# Altium footprint library adafruit.PCBLIB: 648 footprints (part 33 of 41)
Each footprint in its own frame and in the unit in brackets; x right, y up, seen from the top. Pads: shape width x height; smd on the part's side, far side on the other; paste and mask are expansions set on the pad; w line width, h text height; cw(c..) or ccw(c..) is an arc to the next point about the centre after c.
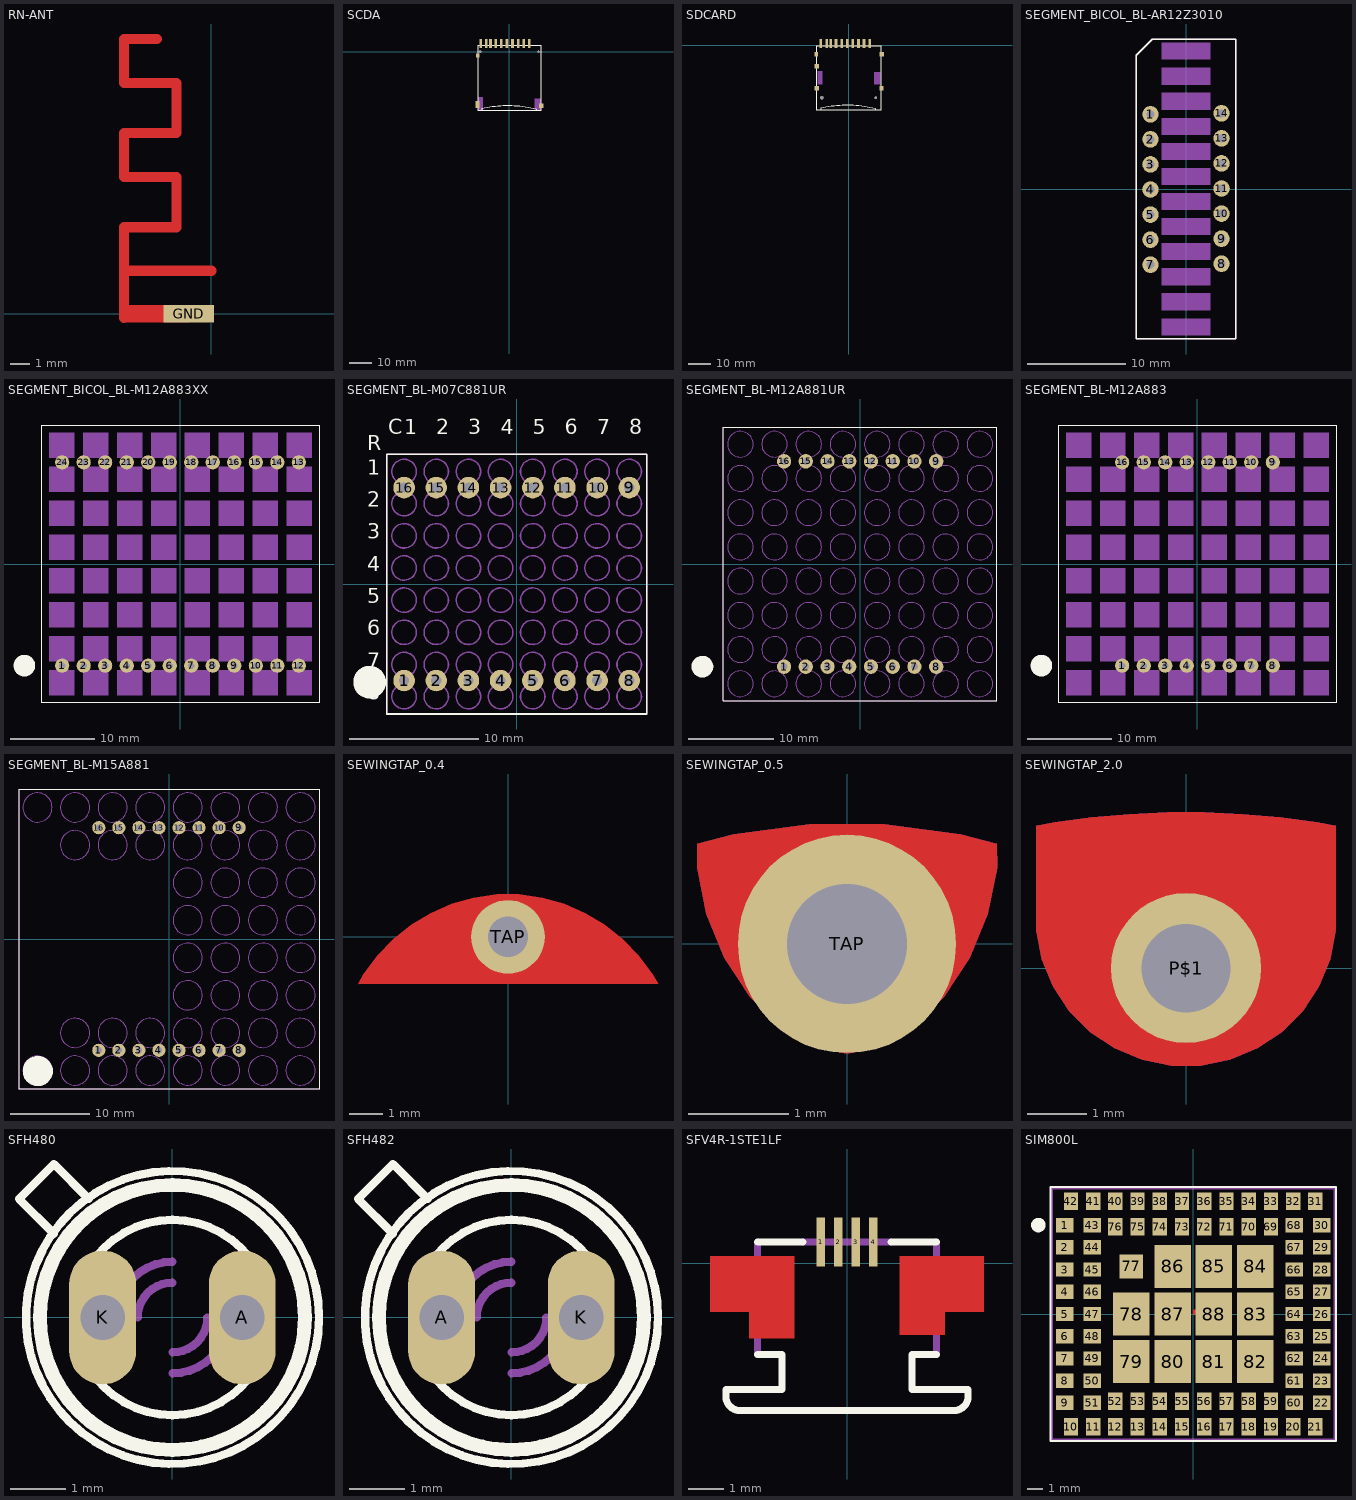
[diagram p32: the footprints below, top view; thin cyan lines are the x and y axes]

## RN-ANT [mil]
pads (2):
  rect 1x1 smd: FEED(0,85)
  rect 100x35 smd: GND(-45,0)
Top Layer:
  lines w20: -173,-8 -173,85 ; -108,543 -173,543 -173,456 -69,456 -69,357 -173,357 -173,270 -69,270 -69,171 -173,171 -173,85 ; 0,85 -173,85
  lines w35: -165,0 -50,0

## SCDA [mm]
pads (15):
  round 1 hole 1: 1(-13,0) 1(13,0)
  rect 1.2x4 smd: 1(6.4,3.7) 2(3.9,3.7) 3(1.4,3.7) 4(-1.1,3.7) 5(-3.6,3.7) 6(-6.1,3.7) 7(-8.4,3.7) 8(-10.4,3.7) 9(8.9,3.7) 10(-12.8,3.7)
  rect 1.7x1.8 smd: 11(-14.1,-1.7)
  rect 1.7x3.1 smd: 12(-14.2,-23.5)
  rect 1.9x1.9 smd: 13(14.2,-24.1)
Top Overlay:
  lines w0.127: -12.4,-26.3 12,-26.3 ; -12.4,-26.3 -14,-26.3 -14,2.8 14.1,2.8 14.1,-26.3 12,-26.3 ; -12.4,-26.3 -12.4,-25.5 cw(c-0.615,-76.23) 12,-25.7 12,-26.3
Mechanical 27:
  rectangle: -14,-26.3 -11.7,-20.2
  rectangle: 11.3,-26.3 14.1,-20.8
  region: 0,0 0.254,0 0.254,0.254 0,0.254

## SDCARD [mm]
pads (17):
  round 1.5 hole 1.5: 1(-12,-23.31)
  rect 1.2x4 smd: 1(6.8,0.89) 2(4.3,0.89) 3(1.8,0.89) 4(-0.7,0.89) 5(-3.1,0.89) 6(-5.7,0.89) 7(-8.1,0.89) 8(-9.8,0.89) 9(9.3,0.89) CD(-12.5,0.89)
  round 1 hole 1: 1(12,-23.31)
  rect 2.032x2.032 smd: COM(-14.2,-9.3) WP(-14.2,-19)
  rect 1.7x1.8 smd: MT1(-14.5,-3.91)
  rect 1.9x1.9 smd: MT2(14.7,-3.91) MT3(14.6,-19.01)
Top Overlay:
  lines w0.127: -12.6,-28.81 11.8,-28.81 ; -12.6,-28.81 -14.2,-28.81 -14.2,-0.01 14.3,-0.01 14.3,-28.81 11.8,-28.81 ; -12.6,-28.81 -12.6,-28.01 cw(c-0.815,-78.74) 11.8,-28.21 11.8,-28.81
Mechanical 27:
  rectangle: -14,-17.41 -11.7,-11.31
  rectangle: 11.3,-17.41 14.1,-11.91
  region: 0,0 0.254,0 0.254,0.254 0,0.254

## SEGMENT_BICOL_BL-AR12Z3010 [mil]
pads (14):
  round 66 hole 31.5: 1(-141.73,298.03) 2(-141.73,198.03) 3(-141.73,98.03) 4(-141.73,-1.97) 5(-141.73,-101.97) 6(-141.73,-201.97) 7(-141.73,-301.97) 8(141.73,-298.03) 9(141.73,-198.03) 10(141.73,-98.03) 11(141.73,1.97) 12(141.73,101.97) 13(141.73,201.97) 14(141.73,301.97)
Top Overlay:
  lines w5: -198.82,-598.43 198.82,-598.43 198.82,598.43 -134.06,598.43 -198.82,534.45 -198.82,-598.43
Mechanical 16:
  rectangle: -98.43,15.75 98.43,84.25
  rectangle: -98.43,115.75 98.43,184.25
  rectangle: -98.43,215.75 98.43,284.25
  rectangle: -98.43,315.75 98.43,384.25
  rectangle: -98.43,415.75 98.43,484.25
  rectangle: -98.43,515.75 98.43,584.25
  rectangle: -98.43,-84.25 98.43,-15.75
  rectangle: -98.43,-184.25 98.43,-115.75
  rectangle: -98.43,-284.25 98.43,-215.75
  rectangle: -98.43,-384.25 98.43,-315.75
  rectangle: -98.43,-484.25 98.43,-415.75
  rectangle: -98.43,-584.25 98.43,-515.75
  lines w5: -198.82,-598.43 198.82,-598.43 198.82,598.43 -134.06,598.43 -198.82,534.45 -198.82,-598.43
  text "A" at 225,525 h77.5
  text "B" at 225,425 h77.5
  text "C" at 225,325 h77.5
  text "D" at 225,225 h77.5
  text "E" at 225,125 h77.5
  text "F" at 225,25 h77.5
  text "G" at 225,-75 h77.5
  text "H" at 225,-175 h77.5
  text "I" at 225,-275 h77.5
  text "J" at 225,-375 h77.5
  text "K" at 225,-475 h77.5
  text "L" at 225,-575 h77.5

## SEGMENT_BICOL_BL-M12A883XX [mil]
pads (24):
  round 66 hole 31.5: 1(-550,-472.44) 2(-450,-472.44) 3(-350,-472.44) 4(-250,-472.44) 5(-150,-472.44) 6(-50,-472.44) 7(50,-472.44) 8(150,-472.44) 9(250,-472.44) 10(350,-472.44) 11(450,-472.44) 12(550,-472.44) 13(550,472.44) 14(450,472.44) 15(350,472.44) 16(250,472.44) 17(150,472.44) 18(50,472.44) 19(-50,472.44) 20(-150,472.44) 21(-250,472.44) 22(-350,472.44) 23(-450,472.44) 24(-550,472.44)
Top Overlay:
  circle w50: c-725.59,-472.44 r25
  lines w5: -643.7,-643.7 643.7,-643.7 643.7,643.7 -643.7,643.7 -643.7,-643.7
Mechanical 16:
  rectangle: -610.24,492.13 -492.13,610.24
  rectangle: -452.76,492.13 -334.65,610.24
  rectangle: -295.28,492.13 -177.17,610.24
  rectangle: -137.8,492.13 -19.69,610.24
  rectangle: 19.69,492.13 137.8,610.24
  rectangle: 177.17,492.13 295.28,610.24
  rectangle: 334.65,492.13 452.76,610.24
  rectangle: 492.13,492.13 610.24,610.24
  rectangle: 492.13,334.65 610.24,452.76
  rectangle: 334.65,334.65 452.76,452.76
  rectangle: 177.17,334.65 295.28,452.76
  rectangle: 19.69,334.65 137.8,452.76
  rectangle: -137.8,334.65 -19.69,452.76
  rectangle: -295.28,334.65 -177.17,452.76
  rectangle: -610.24,334.65 -492.13,452.76
  rectangle: -452.76,334.65 -334.65,452.76
  rectangle: -610.24,177.17 -492.13,295.28
  rectangle: -452.76,177.17 -334.65,295.28
  rectangle: -295.28,177.17 -177.17,295.28
  rectangle: -137.8,177.17 -19.69,295.28
  rectangle: 19.69,177.17 137.8,295.28
  rectangle: 177.17,177.17 295.28,295.28
  rectangle: 334.65,177.17 452.76,295.28
  rectangle: 492.13,177.17 610.24,295.28
  rectangle: 492.13,19.69 610.24,137.8
  rectangle: 492.13,-137.8 610.24,-19.69
  rectangle: 334.65,-137.8 452.76,-19.69
  rectangle: 334.65,19.69 452.76,137.8
  rectangle: 177.17,19.69 295.28,137.8
  rectangle: 19.69,19.69 137.8,137.8
  rectangle: -137.8,19.69 -19.69,137.8
  rectangle: -295.28,19.69 -177.17,137.8
  rectangle: -452.76,19.69 -334.65,137.8
  rectangle: -610.24,19.69 -492.13,137.8
  rectangle: -610.24,-137.8 -492.13,-19.69
  rectangle: -452.76,-137.8 -334.65,-19.69
  rectangle: -295.28,-137.8 -177.17,-19.69
  rectangle: -137.8,-137.8 -19.69,-19.69
  rectangle: 19.69,-137.8 137.8,-19.69
  rectangle: 177.17,-137.8 295.28,-19.69
  rectangle: 492.13,-295.28 610.24,-177.17
  rectangle: 334.65,-295.28 452.76,-177.17
  rectangle: -610.24,-295.28 -492.13,-177.17
  rectangle: -452.76,-295.28 -334.65,-177.17
  rectangle: -295.28,-295.28 -177.17,-177.17
  rectangle: -137.8,-295.28 -19.69,-177.17
  rectangle: 19.69,-295.28 137.8,-177.17
  rectangle: 177.17,-295.28 295.28,-177.17
  rectangle: 492.13,-452.76 610.24,-334.65
  rectangle: 334.65,-452.76 452.76,-334.65
  rectangle: -610.24,-452.76 -492.13,-334.65
  rectangle: -452.76,-452.76 -334.65,-334.65
  rectangle: -295.28,-452.76 -177.17,-334.65
  rectangle: -137.8,-452.76 -19.69,-334.65
  rectangle: 19.69,-452.76 137.8,-334.65
  rectangle: 177.17,-452.76 295.28,-334.65
  rectangle: 492.13,-610.24 610.24,-492.13
  rectangle: 334.65,-610.24 452.76,-492.13
  rectangle: -610.24,-610.24 -492.13,-492.13
  rectangle: -452.76,-610.24 -334.65,-492.13
  rectangle: -295.28,-610.24 -177.17,-492.13
  rectangle: -137.8,-610.24 -19.69,-492.13
  rectangle: 19.69,-610.24 137.8,-492.13
  rectangle: 177.17,-610.24 295.28,-492.13
  lines w5: -643.7,-643.7 643.7,-643.7 643.7,643.7 -643.7,643.7 -643.7,-643.7

## SEGMENT_BL-M07C881UR [mil]
pads (16):
  round 66 hole 31.5: 1(-344.49,-295.28) 2(-246.06,-295.28) 3(-147.64,-295.28) 4(-49.21,-295.28) 5(49.21,-295.28) 6(147.64,-295.28) 7(246.06,-295.28) 8(344.49,-295.28) 9(344.49,295.28) 10(246.06,295.28) 11(147.64,295.28) 12(49.21,295.28) 13(-49.21,295.28) 14(-147.64,295.28) 15(-246.06,295.28) 16(-344.49,295.28)
Top Overlay:
  circle w50: c-450,-300 r25
  lines w5: -397.64,-397.64 397.64,-397.64 397.64,397.64 -397.64,397.64 -397.64,-397.64
  text "C" at -393.7,442.91 h77.5
  text "R" at -457.09,393.7 h77.5
  text "1" at -344.49,442.91 h77.5
  text "2" at -246.06,442.91 h77.5
  text "3" at -147.64,442.91 h77.5
  text "4" at -49.21,442.91 h77.5
  text "5" at 49.21,442.91 h77.5
  text "6" at 147.64,442.91 h77.5
  text "7" at 246.06,442.91 h77.5
  text "8" at 344.49,442.91 h77.5
  text "1" at -457.09,319.88 h77.5
  text "2" at -457.09,221.46 h77.5
  text "3" at -457.09,123.03 h77.5
  text "4" at -457.09,24.61 h77.5
  text "5" at -457.09,-73.82 h77.5
  text "6" at -457.09,-172.24 h77.5
  text "7" at -457.09,-270.67 h77.5
  text "8" at -457.09,-369.09 h77.5
Mechanical 16:
  circle w5: c-344.49,344.49 r37.4
  circle w5: c-246.06,344.49 r37.4
  circle w5: c-147.64,344.49 r37.4
  circle w5: c-49.21,344.49 r37.4
  circle w5: c49.21,344.49 r37.4
  circle w5: c147.64,344.49 r37.4
  circle w5: c246.06,344.49 r37.4
  circle w5: c344.49,344.49 r37.4
  circle w5: c-344.49,246.06 r37.4
  circle w5: c-246.06,246.06 r37.4
  circle w5: c-147.64,246.06 r37.4
  circle w5: c-49.21,246.06 r37.4
  circle w5: c49.21,246.06 r37.4
  circle w5: c147.64,246.06 r37.4
  circle w5: c246.06,246.06 r37.4
  circle w5: c344.49,246.06 r37.4
  circle w5: c-344.49,147.64 r37.4
  circle w5: c-246.06,147.64 r37.4
  circle w5: c-147.64,147.64 r37.4
  circle w5: c-49.21,147.64 r37.4
  circle w5: c49.21,147.64 r37.4
  circle w5: c147.64,147.64 r37.4
  circle w5: c246.06,147.64 r37.4
  circle w5: c344.49,147.64 r37.4
  circle w5: c-344.49,49.21 r37.4
  circle w5: c-246.06,49.21 r37.4
  circle w5: c-147.64,49.21 r37.4
  circle w5: c-49.21,49.21 r37.4
  circle w5: c49.21,49.21 r37.4
  circle w5: c147.64,49.21 r37.4
  circle w5: c246.06,49.21 r37.4
  circle w5: c344.49,49.21 r37.4
  circle w5: c-344.49,-49.21 r37.4
  circle w5: c-246.06,-49.21 r37.4
  circle w5: c-147.64,-49.21 r37.4
  circle w5: c-49.21,-49.21 r37.4
  circle w5: c49.21,-49.21 r37.4
  circle w5: c147.64,-49.21 r37.4
  circle w5: c246.06,-49.21 r37.4
  circle w5: c344.49,-49.21 r37.4
  circle w5: c-344.49,-147.64 r37.4
  circle w5: c-246.06,-147.64 r37.4
  circle w5: c-147.64,-147.64 r37.4
  circle w5: c-49.21,-147.64 r37.4
  circle w5: c49.21,-147.64 r37.4
  circle w5: c147.64,-147.64 r37.4
  circle w5: c246.06,-147.64 r37.4
  circle w5: c344.49,-147.64 r37.4
  circle w5: c-344.49,-246.06 r37.4
  circle w5: c-246.06,-246.06 r37.4
  circle w5: c-147.64,-246.06 r37.4
  circle w5: c-49.21,-246.06 r37.4
  circle w5: c49.21,-246.06 r37.4
  circle w5: c147.64,-246.06 r37.4
  circle w5: c246.06,-246.06 r37.4
  circle w5: c344.49,-246.06 r37.4
  circle w5: c-344.49,-344.49 r37.4
  circle w5: c-246.06,-344.49 r37.4
  circle w5: c-147.64,-344.49 r37.4
  circle w5: c-49.21,-344.49 r37.4
  circle w5: c49.21,-344.49 r37.4
  circle w5: c147.64,-344.49 r37.4
  circle w5: c246.06,-344.49 r37.4
  circle w5: c344.49,-344.49 r37.4
  lines w5: -397.64,-397.64 397.64,-397.64 397.64,397.64 -397.64,397.64 -397.64,-397.64

## SEGMENT_BL-M12A881UR [mil]
pads (16):
  round 66 hole 31.5: 1(-350,-472.44) 2(-250,-472.44) 3(-150,-472.44) 4(-50,-472.44) 5(50,-472.44) 6(150,-472.44) 7(250,-472.44) 8(350,-472.44) 9(350,472.44) 10(250,472.44) 11(150,472.44) 12(50,472.44) 13(-50,472.44) 14(-150,472.44) 15(-250,472.44) 16(-350,472.44)
Top Overlay:
  circle w50: c-725.59,-472.44 r25
  lines w5: -629.92,-629.92 -629.92,629.92 629.92,629.92 629.92,-629.92 -629.92,-629.92
Mechanical 16:
  circle w5: c551.18,-551.18 r59.06
  circle w5: c393.7,-551.18 r59.06
  circle w5: c236.22,-551.18 r59.06
  circle w5: c78.74,-551.18 r59.06
  circle w5: c-78.74,-551.18 r59.06
  circle w5: c-236.22,-551.18 r59.06
  circle w5: c-393.7,-551.18 r59.06
  circle w5: c-551.18,-551.18 r59.06
  circle w5: c551.18,-393.7 r59.06
  circle w5: c393.7,-393.7 r59.06
  circle w5: c236.22,-393.7 r59.06
  circle w5: c78.74,-393.7 r59.06
  circle w5: c-78.74,-393.7 r59.06
  circle w5: c-236.22,-393.7 r59.06
  circle w5: c-393.7,-393.7 r59.06
  circle w5: c-551.18,-393.7 r59.06
  circle w5: c551.18,-236.22 r59.06
  circle w5: c393.7,-236.22 r59.06
  circle w5: c236.22,-236.22 r59.06
  circle w5: c78.74,-236.22 r59.06
  circle w5: c-78.74,-236.22 r59.06
  circle w5: c-236.22,-236.22 r59.06
  circle w5: c-393.7,-236.22 r59.06
  circle w5: c-551.18,-236.22 r59.06
  circle w5: c551.18,-78.74 r59.06
  circle w5: c393.7,-78.74 r59.06
  circle w5: c236.22,-78.74 r59.06
  circle w5: c78.74,-78.74 r59.06
  circle w5: c-78.74,-78.74 r59.06
  circle w5: c-236.22,-78.74 r59.06
  circle w5: c-393.7,-78.74 r59.06
  circle w5: c-551.18,-78.74 r59.06
  circle w5: c551.18,78.74 r59.06
  circle w5: c393.7,78.74 r59.06
  circle w5: c236.22,78.74 r59.06
  circle w5: c78.74,78.74 r59.06
  circle w5: c-78.74,78.74 r59.06
  circle w5: c-236.22,78.74 r59.06
  circle w5: c-393.7,78.74 r59.06
  circle w5: c-551.18,78.74 r59.06
  circle w5: c551.18,236.22 r59.06
  circle w5: c393.7,236.22 r59.06
  circle w5: c236.22,236.22 r59.06
  circle w5: c78.74,236.22 r59.06
  circle w5: c-78.74,236.22 r59.06
  circle w5: c-236.22,236.22 r59.06
  circle w5: c-393.7,236.22 r59.06
  circle w5: c-551.18,236.22 r59.06
  circle w5: c551.18,393.7 r59.06
  circle w5: c393.7,393.7 r59.06
  circle w5: c236.22,393.7 r59.06
  circle w5: c78.74,393.7 r59.06
  circle w5: c-78.74,393.7 r59.06
  circle w5: c-236.22,393.7 r59.06
  circle w5: c-393.7,393.7 r59.06
  circle w5: c-551.18,393.7 r59.06
  circle w5: c551.18,551.18 r59.06
  circle w5: c393.7,551.18 r59.06
  circle w5: c236.22,551.18 r59.06
  circle w5: c78.74,551.18 r59.06
  circle w5: c-78.74,551.18 r59.06
  circle w5: c-236.22,551.18 r59.06
  circle w5: c-393.7,551.18 r59.06
  circle w5: c-551.18,551.18 r59.06
  lines w5: -629.92,-629.92 -629.92,629.92 629.92,629.92 629.92,-629.92 -629.92,-629.92

## SEGMENT_BL-M12A883 [mil]
pads (16):
  round 66 hole 31.5: 1(-350,-472.44) 2(-250,-472.44) 3(-150,-472.44) 4(-50,-472.44) 5(50,-472.44) 6(150,-472.44) 7(250,-472.44) 8(350,-472.44) 9(350,472.44) 10(250,472.44) 11(150,472.44) 12(50,472.44) 13(-50,472.44) 14(-150,472.44) 15(-250,472.44) 16(-350,472.44)
Top Overlay:
  circle w50: c-725.59,-472.44 r25
  lines w5: -643.7,-643.7 643.7,-643.7 643.7,643.7 -643.7,643.7 -643.7,-643.7
Mechanical 16:
  rectangle: -610.24,492.13 -492.13,610.24
  rectangle: -452.76,492.13 -334.65,610.24
  rectangle: -295.28,492.13 -177.17,610.24
  rectangle: -137.8,492.13 -19.69,610.24
  rectangle: 19.69,492.13 137.8,610.24
  rectangle: 177.17,492.13 295.28,610.24
  rectangle: 334.65,492.13 452.76,610.24
  rectangle: 492.13,492.13 610.24,610.24
  rectangle: 492.13,334.65 610.24,452.76
  rectangle: 334.65,334.65 452.76,452.76
  rectangle: 177.17,334.65 295.28,452.76
  rectangle: 19.69,334.65 137.8,452.76
  rectangle: -137.8,334.65 -19.69,452.76
  rectangle: -295.28,334.65 -177.17,452.76
  rectangle: -610.24,334.65 -492.13,452.76
  rectangle: -452.76,334.65 -334.65,452.76
  rectangle: -610.24,177.17 -492.13,295.28
  rectangle: -452.76,177.17 -334.65,295.28
  rectangle: -295.28,177.17 -177.17,295.28
  rectangle: -137.8,177.17 -19.69,295.28
  rectangle: 19.69,177.17 137.8,295.28
  rectangle: 177.17,177.17 295.28,295.28
  rectangle: 334.65,177.17 452.76,295.28
  rectangle: 492.13,177.17 610.24,295.28
  rectangle: 492.13,19.69 610.24,137.8
  rectangle: 492.13,-137.8 610.24,-19.69
  rectangle: 334.65,-137.8 452.76,-19.69
  rectangle: 334.65,19.69 452.76,137.8
  rectangle: 177.17,19.69 295.28,137.8
  rectangle: 19.69,19.69 137.8,137.8
  rectangle: -137.8,19.69 -19.69,137.8
  rectangle: -295.28,19.69 -177.17,137.8
  rectangle: -452.76,19.69 -334.65,137.8
  rectangle: -610.24,19.69 -492.13,137.8
  rectangle: -610.24,-137.8 -492.13,-19.69
  rectangle: -452.76,-137.8 -334.65,-19.69
  rectangle: -295.28,-137.8 -177.17,-19.69
  rectangle: -137.8,-137.8 -19.69,-19.69
  rectangle: 19.69,-137.8 137.8,-19.69
  rectangle: 177.17,-137.8 295.28,-19.69
  rectangle: 492.13,-295.28 610.24,-177.17
  rectangle: 334.65,-295.28 452.76,-177.17
  rectangle: -610.24,-295.28 -492.13,-177.17
  rectangle: -452.76,-295.28 -334.65,-177.17
  rectangle: -295.28,-295.28 -177.17,-177.17
  rectangle: -137.8,-295.28 -19.69,-177.17
  rectangle: 19.69,-295.28 137.8,-177.17
  rectangle: 177.17,-295.28 295.28,-177.17
  rectangle: 492.13,-452.76 610.24,-334.65
  rectangle: 334.65,-452.76 452.76,-334.65
  rectangle: -610.24,-452.76 -492.13,-334.65
  rectangle: -452.76,-452.76 -334.65,-334.65
  rectangle: -295.28,-452.76 -177.17,-334.65
  rectangle: -137.8,-452.76 -19.69,-334.65
  rectangle: 19.69,-452.76 137.8,-334.65
  rectangle: 177.17,-452.76 295.28,-334.65
  rectangle: 492.13,-610.24 610.24,-492.13
  rectangle: 334.65,-610.24 452.76,-492.13
  rectangle: -610.24,-610.24 -492.13,-492.13
  rectangle: -452.76,-610.24 -334.65,-492.13
  rectangle: -295.28,-610.24 -177.17,-492.13
  rectangle: -137.8,-610.24 -19.69,-492.13
  rectangle: 19.69,-610.24 137.8,-492.13
  rectangle: 177.17,-610.24 295.28,-492.13
  lines w5: -643.7,-643.7 643.7,-643.7 643.7,643.7 -643.7,643.7 -643.7,-643.7

## SEGMENT_BL-M15A881 [mil]
pads (16):
  round 66 hole 31.5: 1(-350,-555.12) 2(-250,-555.12) 3(-150,-555.12) 4(-50,-555.12) 5(50,-555.12) 6(150,-555.12) 7(250,-555.12) 8(350,-555.12) 9(350,555.12) 10(250,555.12) 11(150,555.12) 12(50,555.12) 13(-50,555.12) 14(-150,555.12) 15(-250,555.12) 16(-350,555.12)
Top Overlay:
  circle w100: c-654.33,-658.66 r25
  lines w5: -748.03,-748.03 748.03,-748.03 748.03,748.03 -748.03,748.03 -748.03,-748.03
Mechanical 16:
  circle w5: c-281.1,468.5 r72.83
  circle w5: c-93.7,468.5 r72.83
  circle w5: c93.7,468.5 r72.83
  circle w5: c281.1,468.5 r72.83
  circle w5: c468.5,468.5 r72.83
  circle w5: c-468.5,468.5 r72.83
  circle w5: c-281.1,655.91 r72.83
  circle w5: c-93.7,655.91 r72.83
  circle w5: c93.7,655.91 r72.83
  circle w5: c281.1,655.91 r72.83
  circle w5: c468.5,655.91 r72.83
  circle w5: c-468.5,655.91 r72.83
  circle w5: c-655.91,655.91 r72.83
  circle w5: c93.7,281.1 r72.83
  circle w5: c281.1,281.1 r72.83
  circle w5: c468.5,281.1 r72.83
  circle w5: c93.7,93.7 r72.83
  circle w5: c281.1,93.7 r72.83
  circle w5: c468.5,93.7 r72.83
  circle w5: c93.7,-93.7 r72.83
  circle w5: c281.1,-93.7 r72.83
  circle w5: c468.5,-93.7 r72.83
  circle w5: c93.7,-281.1 r72.83
  circle w5: c281.1,-281.1 r72.83
  circle w5: c468.5,-281.1 r72.83
  circle w5: c-281.1,-468.5 r72.83
  circle w5: c-93.7,-468.5 r72.83
  circle w5: c93.7,-468.5 r72.83
  circle w5: c281.1,-468.5 r72.83
  circle w5: c468.5,-468.5 r72.83
  circle w5: c-468.5,-468.5 r72.83
  circle w5: c-281.1,-655.91 r72.83
  circle w5: c-93.7,-655.91 r72.83
  circle w5: c93.7,-655.91 r72.83
  circle w5: c281.1,-655.91 r72.83
  circle w5: c468.5,-655.91 r72.83
  circle w5: c-468.5,-655.91 r72.83
  circle w5: c-655.91,-655.91 r72.83
  circle w5: c655.91,-93.7 r72.83
  circle w5: c655.91,93.7 r72.83
  circle w5: c655.91,281.1 r72.83
  circle w5: c655.91,468.5 r72.83
  circle w5: c655.91,655.91 r72.83
  circle w5: c655.91,-281.1 r72.83
  circle w5: c655.91,-468.5 r72.83
  circle w5: c655.91,-655.91 r72.83
  lines w5: -748.03,-748.03 748.03,-748.03 748.03,748.03 -748.03,748.03 -748.03,-748.03

## SEWINGTAP_0.4 [mil]
pads (1):
  round 86 hole 47.24: TAP(0,0)
Top Layer:
  region: -175,-55 175,-55 168.51,-43.3 152.58,-21.81 133.98,-2.58 113.04,14.06 90.1,27.83 65.56,38.48 39.84,45.84 13.37,49.77 0,50 -13.37,49.77 -39.84,45.84 -65.56,38.48 -90.1,27.83 -113.04,14.06 -133.98,-2.58 -152.58,-21.81 -168.51,-43.3
Top Solder:
  region: -175,-55 175,-55 168.51,-43.3 152.58,-21.81 133.98,-2.58 113.04,14.06 90.1,27.83 65.56,38.48 39.84,45.84 13.37,49.77 0,50 -13.37,49.77 -39.84,45.84 -65.56,38.48 -90.1,27.83 -113.04,14.06 -133.98,-2.58 -152.58,-21.81 -168.51,-43.3

## SEWINGTAP_0.5 [mil]
pads (1):
  round 86 hole 47.24: TAP(0,0)
Top Layer:
  region: 59.06,39.37 44.61,43.24 14.96,47.15 -14.96,47.15 -44.61,43.24 -59.06,39.37 -59.08,30.06 -55.48,11.78 -48.39,-5.45 -38.07,-20.96 -31.5,-27.56 -28.16,-30.52 -20.78,-35.51 -12.8,-39.5 -4.37,-42.42 0,-43.31 4.37,-42.42 12.8,-39.5 20.78,-35.51 28.16,-30.52 31.5,-27.56 38.07,-20.96 48.39,-5.45 55.48,11.78 59.08,30.06
Bottom Layer:
  region: 59.06,39.37 44.61,43.24 14.96,47.15 -14.96,47.15 -44.61,43.24 -59.06,39.37 -59.08,30.06 -55.48,11.78 -48.39,-5.45 -38.07,-20.96 -31.5,-27.56 -28.16,-30.52 -20.78,-35.51 -12.8,-39.5 -4.37,-42.42 0,-43.31 4.37,-42.42 12.8,-39.5 20.78,-35.51 28.16,-30.52 31.5,-27.56 38.07,-20.96 48.39,-5.45 55.48,11.78 59.08,30.06
Top Solder:
  region: 59.06,39.37 44.61,43.24 14.96,47.15 -14.96,47.15 -44.61,43.24 -59.06,39.37 -59.08,30.06 -55.48,11.78 -48.39,-5.45 -38.07,-20.96 -31.5,-27.56 -28.16,-30.52 -20.78,-35.51 -12.8,-39.5 -4.37,-42.42 0,-43.31 4.37,-42.42 12.8,-39.5 20.78,-35.51 28.16,-30.52 31.5,-27.56 38.07,-20.96 48.39,-5.45 55.48,11.78 59.08,30.06
Bottom Solder:
  region: 59.06,39.37 44.61,43.24 14.96,47.15 -14.96,47.15 -44.61,43.24 -59.06,39.37 -59.08,30.06 -55.48,11.78 -48.39,-5.45 -38.07,-20.96 -31.5,-27.56 -28.16,-30.52 -20.78,-35.51 -12.8,-39.5 -4.37,-42.42 0,-43.31 4.37,-42.42 12.8,-39.5 20.78,-35.51 28.16,-30.52 31.5,-27.56 38.07,-20.96 48.39,-5.45 55.48,11.78 59.08,30.06

## SEWINGTAP_2.0 [mil]
pads (1):
  round 100 hole 59.06: P$1(0,0)
Top Layer:
  region: 100,95 87.63,97.18 62.71,100.46 37.67,102.65 12.57,103.75 -12.57,103.75 -37.67,102.65 -62.71,100.46 -87.63,97.18 -100,95 -100,35 -100,25.15 -96.16,5.83 -88.62,-12.37 -77.67,-28.75 -63.75,-42.67 -47.37,-53.62 -29.17,-61.16 -9.85,-65 0,-65 9.85,-65 29.17,-61.16 47.37,-53.62 63.75,-42.67 77.67,-28.75 88.62,-12.37 96.16,5.83 100,25.15 100,35
Bottom Layer:
  region: 100,95 87.63,97.18 62.71,100.46 37.67,102.65 12.57,103.75 -12.57,103.75 -37.67,102.65 -62.71,100.46 -87.63,97.18 -100,95 -100,35 -100,25.15 -96.16,5.83 -88.62,-12.37 -77.67,-28.75 -63.75,-42.67 -47.37,-53.62 -29.17,-61.16 -9.85,-65 0,-65 9.85,-65 29.17,-61.16 47.37,-53.62 63.75,-42.67 77.67,-28.75 88.62,-12.37 96.16,5.83 100,25.15 100,35
Top Solder:
  region: 100,95 87.63,97.18 62.71,100.46 37.67,102.65 12.57,103.75 -12.57,103.75 -37.67,102.65 -62.71,100.46 -87.63,97.18 -100,95 -100,35 -100,25.15 -96.16,5.83 -88.62,-12.37 -77.67,-28.75 -63.75,-42.67 -47.37,-53.62 -29.17,-61.16 -9.85,-65 0,-65 9.85,-65 29.17,-61.16 47.37,-53.62 63.75,-42.67 77.67,-28.75 88.62,-12.37 96.16,5.83 100,25.15 100,35
Bottom Solder:
  region: 100,95 87.63,97.18 62.71,100.46 37.67,102.65 12.57,103.75 -12.57,103.75 -37.67,102.65 -62.71,100.46 -87.63,97.18 -100,95 -100,35 -100,25.15 -96.16,5.83 -88.62,-12.37 -77.67,-28.75 -63.75,-42.67 -47.37,-53.62 -29.17,-61.16 -9.85,-65 0,-65 9.85,-65 29.17,-61.16 47.37,-53.62 63.75,-42.67 77.67,-28.75 88.62,-12.37 96.16,5.83 100,25.15 100,35

## SFH480 [mil]
pads (2):
  oval 48x96 hole 32: A(50,0) K(-50,0)
Top Overlay:
  circle w6: c0,0 r105
  circle w10: c0,0 r95
  lines w6: -85,60 -110,85 -85,110 -60,85 ; -60.46,-35.27 ccw(c0,0) 0,-70 ccw(c0,0) 60.46,-35.27 ; -60.46,35.27 cw(c0,0) 0,70 cw(c0,0) 60.46,35.27
Mechanical 16:
  lines w6: -59.61,-36.69 cw(c0.01,0.01) -70,0 cw(c-0.01,0.01) -59.06,37.58 ; -40,0 cw(c0,0) 0,40 ; -25,0 cw(c0,0) 0,25 ; 0,-40 ccw(c0,0) 40,0 ; 0,-25 ccw(c0,0) 25,0 ; 59.06,-37.58 ccw(c0.01,-0.01) 70,0 ccw(c-0.01,-0.01) 59.61,36.69

## SFH482 [mil]
pads (2):
  oval 48x96 hole 32: A(-50,0) K(50,0)
Top Overlay:
  circle w10: c0,0 r95
  circle w6: c0,0 r105
  lines w6: -85,60 -110,85 -85,110 -60,85 ; -60.46,-35.27 ccw(c0,0) 0,-70 ccw(c0,0) 60.46,-35.27 ; -60.46,35.27 cw(c0,0) 0,70 cw(c0,0) 60.46,35.27
Mechanical 16:
  lines w6: -59.61,-36.69 cw(c0.01,0.01) -70,0 cw(c-0.01,0.01) -59.06,37.58 ; -40,0 cw(c0,0) 0,40 ; -25,0 cw(c0,0) 0,25 ; 0,-40 ccw(c0,0) 40,0 ; 0,-25 ccw(c0,0) 25,0 ; 59.06,-37.58 ccw(c0.01,-0.01) 70,0 ccw(c-0.01,-0.01) 59.61,36.69

## SFV4R-1STE1LF [mil]
pads (4):
  rect 9.84x55.12 smd: 1(-29.53,23.62) 2(-9.84,23.62) 3(9.84,23.62) 4(29.53,23.62)
Top Layer:
  rectangle: -153.54,-55.12 -59.06,7.87
  rectangle: -110.24,-84.65 -59.06,-51.18
  rectangle: 59.06,-55.12 153.54,7.87
  rectangle: 59.06,-80.71 110.24,-47.24
Top Overlay:
  lines w8: -100.39,-102.36 -72.83,-102.36 -72.83,-141.73 -135.83,-141.73 -135.83,-149.61 ccw(c-120.08,-149.6) -120.08,-165.35 120.08,-165.35 ccw(c120.08,-149.6) 135.83,-149.61 135.83,-141.73 72.83,-141.73 72.83,-102.36 100.39,-102.36 ; -100.39,23.62 -49.21,23.62 ; 49.21,23.62 100.39,23.62
Top Paste:
  rectangle: -168.31,-74.8 -82.68,2.95
  rectangle: -125.98,-108.27 -82.68,-74.8
  rectangle: 82.68,-74.8 168.31,2.95
  rectangle: 82.68,-108.27 125.98,-74.8
Top Solder:
  rectangle: -110.24,-84.65 -59.06,-51.18
  rectangle: -35.43,-3.94 -23.62,51.18
  rectangle: -15.75,-3.94 -3.94,51.18
  rectangle: 3.94,-3.94 15.75,51.18
  rectangle: 23.62,-3.94 35.43,51.18
  rectangle: -153.54,-55.12 -59.06,7.87
  rectangle: 59.06,-55.12 153.54,7.87
  rectangle: 59.06,-82.68 110.24,-55.12
Mechanical 16:
  lines w8: -100.39,-102.36 -100.39,23.62 ; -49.21,23.62 49.21,23.62 ; 100.39,-102.36 100.39,23.62
  lines w19.69: -137.8,-39.37 -106.3,-39.37 -106.3,-5.91 -137.8,-5.91 ; 137.8,-39.37 106.3,-39.37 106.3,-5.91 137.8,-5.91

## SIM800L [mm]
pads (88):
  rect 1.1x0.9 smd: 1(-8.1,5.6) 2(-8.1,4.2) 3(-8.1,2.8) 4(-8.1,1.4) 5(-8.1,0) 6(-8.1,-1.4) 7(-8.1,-2.8) 8(-8.1,-4.2) 9(-8.1,-5.6) 22(8.1,-5.6) 23(8.1,-4.2) 24(8.1,-2.8) 25(8.1,-1.4) 26(8.1,0) 27(8.1,1.4) 28(8.1,2.8) 29(8.1,4.2) 30(8.1,5.6) 43(-6.36,5.6) 44(-6.36,4.2) 45(-6.36,2.8) 46(-6.36,1.4) 47(-6.36,0) 48(-6.36,-1.4) 49(-6.36,-2.8) 50(-6.36,-4.2) 51(-6.36,-5.6) 60(6.36,-5.6) 61(6.36,-4.2) 62(6.36,-2.8) 63(6.36,-1.4) 64(6.36,0) 65(6.36,1.4) 66(6.36,2.8) 67(6.36,4.2) 68(6.36,5.6)
  rect 0.9x1.1 smd: 10(-7.7,-7.1) 11(-6.3,-7.1) 12(-4.9,-7.1) 13(-3.5,-7.1) 14(-2.1,-7.1) 15(-0.7,-7.1) 16(0.7,-7.1) 17(2.1,-7.1) 18(3.5,-7.1) 19(4.9,-7.1) 20(6.3,-7.1) 21(7.7,-7.1) 31(7.7,7.1) 32(6.3,7.1) 33(4.9,7.1) 34(3.5,7.1) 35(2.1,7.1) 36(0.7,7.1) 37(-0.7,7.1) 38(-2.1,7.1) 39(-3.5,7.1) 40(-4.9,7.1) 41(-6.3,7.1) 42(-7.7,7.1) 52(-4.9,-5.5) 53(-3.5,-5.5) 54(-2.1,-5.5) 55(-0.7,-5.5) 56(0.7,-5.5) 57(2.1,-5.5) 58(3.5,-5.5) 59(4.9,-5.5) 69(4.9,5.5) 70(3.5,5.5) 71(2.1,5.5) 72(0.7,5.5) 73(-0.7,5.5) 74(-2.1,5.5) 75(-3.5,5.5) 76(-4.9,5.5)
  rect 1.5x1.5 smd: 77(-3.9,3)
  rect 2.3x2.7 smd: 78(-3.9,0) 79(-3.9,-3) 80(-1.3,-3) 81(1.3,-3) 82(3.9,-3) 83(3.9,0) 84(3.9,3) 85(1.3,3) 86(-1.3,3) 87(-1.3,0) 88(1.3,0)
Top Layer:
  region: 0,0 0.254,0 0.254,0.254 0,0.254
Top Overlay:
  circle w0.61: c-9.75,5.6 r0.15
  lines w0.127: -9,-8 -9,8 9,8 9,-8 -9,-8
Mechanical 16:
  lines w0.127: -8.9,-7.9 8.9,-7.9 8.9,7.9 -8.9,7.9 -8.9,-7.9